# Altium footprint library DrPCB.PcbLib: 910 footprints (part 23 of 57)
Each footprint in its own frame and in the unit in brackets; x right, y up, seen from the top. Pads: shape width x height; smd on the part's side, far side on the other; paste and mask are expansions set on the pad; w line width, h text height; cw(c..) or ccw(c..) is an arc to the next point about the centre after c.
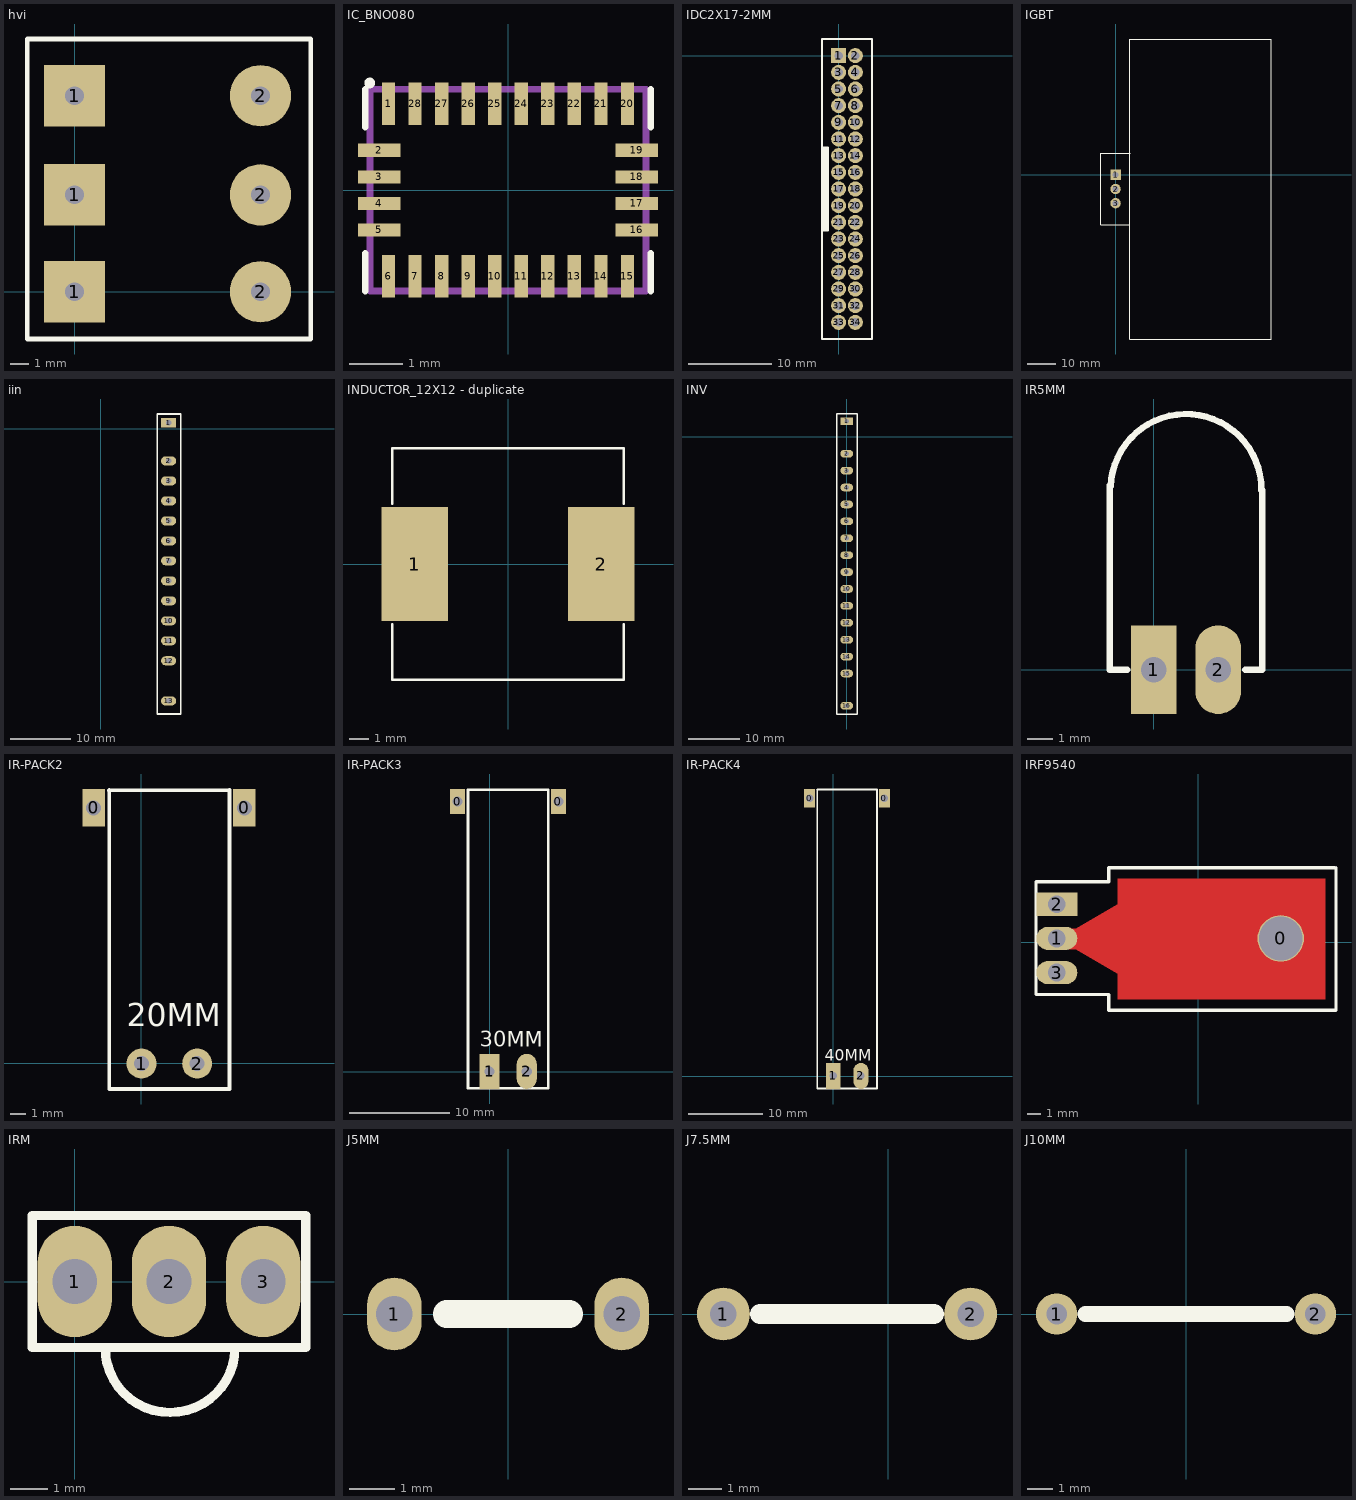
[diagram p22: the footprints below, top view; thin cyan lines are the x and y axes]

## hvi [mm]
pads (6):
  rect 3.3x3.3 hole 1: 1(0,0) 1(0,5.207) 1(0,10.541)
  round 3.3 hole 1: 2(10,0) 2(10,5.207) 2(10,10.541)
Top Overlay:
  lines w0.254: -2.54,-2.54 12.7,-2.54 12.7,13.589 -2.54,13.589 -2.54,-2.54

## IC_BNO080 [mm]
pads (28):
  rect 0.25x0.8 smd: 1(-2.25,1.625) 6(-2.25,-1.625) 7(-1.75,-1.625) 8(-1.25,-1.625) 9(-0.75,-1.625) 10(-0.25,-1.625) 11(0.25,-1.625) 12(0.75,-1.625) 13(1.25,-1.625) 14(1.75,-1.625) 15(2.25,-1.625) 20(2.25,1.625) 21(1.75,1.625) 22(1.25,1.625) 23(0.75,1.625) 24(0.25,1.625) 25(-0.25,1.625) 26(-0.75,1.625) 27(-1.25,1.625) 28(-1.75,1.625)
  rect 0.8x0.25 smd: 2(-2.425,0.75) 3(-2.425,0.25) 4(-2.425,-0.25) 5(-2.425,-0.75) 16(2.425,-0.75) 17(2.425,-0.25) 18(2.425,0.25) 19(2.425,0.75)
Top Overlay:
  circle w0.1: c-2.603,2.019 r0.05
  lines w0.127: -2.689,-1.9 -2.689,-1.188 ; -2.689,1.188 -2.689,1.9 ; 2.689,-1.9 2.689,-1.188 ; 2.689,1.188 2.689,1.9
Mechanical 13:
  lines w0.127: -2.6,-1.9 2.6,-1.9 2.6,1.9 -2.6,1.9 -2.6,-1.9
3D body "BNO080--3DModel-STEP-56544.STEP": height 1.18, standoff 0, extent -2.6,-1.9 2.6,1.9

## IDC2X17-2MM [mm]
pads (34):
  rect 1.8x1.8 hole 1: 1(0,0)
  round 1.8 hole 1: 2(2,0) 3(0,-2) 4(2,-2) 5(0,-4) 6(2,-4) 7(0,-6) 8(2,-6) 9(0,-8) 10(2,-8) 11(0,-10) 12(2,-10) 13(0,-12) 14(2,-12) 15(0,-14) 16(2,-14) 17(0,-16) 18(2,-16) 19(0,-18) 20(2,-18) 21(0,-20) 22(2,-20) 23(0,-22) 24(2,-22) 25(0,-24) 26(2,-24) 27(0,-26) 28(2,-26) 29(0,-28) 30(2,-28) 31(0,-30) 32(2,-30) 33(0,-32) 34(2,-32)
Top Overlay:
  lines w0.254: -1.905,-20.955 -1.27,-20.955 -1.27,-11.049 -1.905,-11.049 ; -1.778,-20.955 -1.778,-11.049 ; -1.524,-20.955 -1.524,-11.049 ; -2,-34 4,-34 4,2 -2,2 -2,-34

## IGBT [mm]
pads (3):
  rect 3.7x3.7 hole 2: 1(0,0)
  round 3.7 hole 2: 2(0,-5) 3(0,-10)
Top Overlay:
  lines w0.254: 4.826,-17.653 -5.207,-17.653 -5.207,7.62 5.207,7.62 ; 5,-10.16 5,-58 55,-58 ; 5.08,-10.16 5.08,48 ; 5.08,48.006 55,48.006 ; 54.991,-57.991 54.991,48.006

## iin [mm]
pads (13):
  rect 2.5x1.5 hole 0.9: 1(11.176,0.968)
  oval 2.5x1.5 hole 0.9: 2(11.176,-5.332) 3(11.176,-8.632) 4(11.176,-11.932) 5(11.176,-15.232) 6(11.176,-18.532) 7(11.176,-21.832) 8(11.176,-25.132) 9(11.176,-28.432) 10(11.176,-31.732) 11(11.176,-35.032) 12(11.176,-38.332) 13(11.176,-44.958)
Top Overlay:
  lines w0.254: 9.271,-47.117 9.271,2.413 13.208,2.413 13.208,-47.117 9.271,-47.117

## INDUCTOR_12X12 - duplicate [mm]
pads (2):
  rect 3.5x6 smd: 1(-4.9,0) 2(4.9,0)
Top Overlay:
  lines w0.15: -6.1,-3.175 -6.1,-6.1 6.1,-6.1 6.1,-3.175 ; -6.1,3.175 -6.1,6.1 6.1,6.1 6.1,3.175
3D body "User Library-DE1207.step": height 8, standoff 0, extent -6,-6 6,6

## INV [mm]
pads (16):
  rect 2.5x1.5 hole 0.9: 1(0,3)
  oval 2.5x1.5 hole 0.9: 2(0,-3.3) 3(0,-6.6) 4(0,-9.9) 5(0,-13.2) 6(0,-16.5) 7(0,-19.8) 8(0,-23.1) 9(0,-26.4) 10(0,-29.7) 11(0,-33) 12(0,-36.3) 13(0,-39.6) 14(0,-42.9) 15(0,-46.2) 16(0,-52.5)
Top Overlay:
  lines w0.254: -1.905,-54.102 2.032,-54.102 2.032,4.445 -1.905,4.445 -1.905,-54.102

## IR5MM [mm]
pads (2):
  rect 1.8x3.5 hole 1: 1(0,0)
  oval 1.8x3.5 hole 1: 2(2.54,0)
Top Overlay:
  lines w0.254: -1.75,0 -1.05,0 ; -1.741,-0.003 -1.741,7.283 ; -1.703,7.234 cw(c1.27,7.117) 4.246,7.088 ; 3.611,0 4.275,0 ; 4.278,0 4.278,7.092

## IR-PACK2 [mm]
pads (4):
  rect 1.5x2.5 hole 1: 0(-3.175,17.018) 0(6.858,17.018)
  round 2 hole 1: 1(0.013,-0.011) 2(3.719,-0.011)
Top Overlay:
  lines w0.254: -2.166,18.163 -2.141,18.187 5.861,18.187 ; -2.138,-1.693 -2.138,18.199 ; -2.127,-1.7 5.873,-1.7 ; 5.87,-1.7 5.87,18.201
  text "20MM" at -0.959,2.464 h1.52

## IR-PACK3 [mm]
pads (4):
  rect 1.5x2.5 hole 1: 0(-3.175,26.924) 0(6.858,26.924)
  rect 2x3.5 hole 1: 1(0.006,0.017)
  oval 2x3.5 hole 1: 2(3.712,0.017)
Top Overlay:
  lines w0.254: -2.166,28.069 -2.141,28.093 ; -2.144,-1.665 -2.144,28.095 -2.125,28.114 5.857,28.114 ; -2.133,-1.672 5.867,-1.672 ; 5.863,-1.672 5.863,28.108
  text "30MM" at -0.965,2.492 h1.52

## IR-PACK4 [mm]
pads (4):
  rect 1.5x2.5 hole 1: 0(-3.175,37.211) 0(6.858,37.211)
  rect 2x3.5 hole 1: 1(0.004,0.057)
  oval 2x3.5 hole 1: 2(3.71,0.057)
Top Overlay:
  lines w0.254: -2.166,38.356 -2.141,38.38 5.861,38.38 ; -2.146,-1.625 -2.146,38.375 ; -2.135,-1.632 5.865,-1.632 ; 5.861,-1.632 5.861,38.368
  text "40MM" at -1.107,2.074 h1.52

## IRF9540 [mm]
pads (4):
  round 3.4 hole 3.2: 0(6.058,0.27)
  oval 3x1.7 hole 1.3: 1(-10.342,0.27) 3(-10.342,-2.23)
  rect 3x1.7 hole 1.3: 2(-10.342,2.77)
Top Layer:
  rectangle: -5.897,-4.215 9.343,4.675
  rectangle: -10.342,-0.532 -5.77,0.992
  region: -5.897,2.77 -8.945,0.992 -8.945,-0.532 -5.897,-2.31
Top Overlay:
  lines w0.254: 9.978,5.437 -6.532,5.437 -6.532,4.421 -11.866,4.421 -11.866,-3.834 -6.532,-3.834 -6.532,-4.977 10.105,-4.977 10.105,5.437

## IRM [mm]
pads (3):
  oval 2x3 hole 1.2: 1(0,0) 2(2.54,0) 3(5.08,0)
Top Overlay:
  lines w0.254: 0.818,-1.778 ccw(c2.568,-1.778) 4.318,-1.778 ; 6.223,1.722 6.223,-1.778 -1.143,-1.778 -1.143,1.778 6.223,1.778

## J5MM [mm] "5.08 mm (200mil) Jumper wire"
pads (2):
  oval 1.2x1.6 hole 0.8: 1(-2.5,0) 2(2.5,0)
Top Overlay:
  lines w0.61: -1.346,0 1.346,0
3D body: height 0.5, standoff -2, extent 2.19,-0.35 2.89,0.35
3D body: height 0.5, standoff -2, extent -2.89,-0.35 -2.19,0.35
3D body: height 0.85, standoff 0.15, extent -2.54,-0.35 2.54,0.35
3D body: height 0.85, standoff 0.15, extent 2.19,-0.35 2.89,0.35
3D body: height 0.85, standoff 0.15, extent -2.89,-0.35 -2.19,0.35

## J7.5MM [mm] "10.16 mm (400 mil) Jumper wire"
pads (2):
  round 1.6 hole 0.8: 1(-5,0) 2(2.5,0)
Top Overlay:
  lines w0.61: -3.886,0 1.386,0
3D body: height 0.5, standoff -2, extent 2.073,-0.348 2.77,0.351
3D body: height 0.5, standoff -2, extent -5.35,-0.35 -4.65,0.35
3D body: height 0.85, standoff 0.15, extent -5.08,-0.347 2.42,0.35
3D body: height 0.85, standoff 0.15, extent 2.07,-0.346 2.77,0.349
3D body: height 0.85, standoff 0.15, extent -5.35,-0.35 -4.65,0.35

## J10MM [mm] "10.16 mm (400 mil) Jumper wire"
pads (2):
  round 1.6 hole 0.8: 1(-5,0) 2(5,0)
Top Overlay:
  lines w0.61: -3.886,0 3.886,0
3D body: height 0.85, standoff 0.15, extent -5.35,-0.35 -4.65,0.35
3D body: height 0.85, standoff 0.15, extent 4.57,-0.348 5.27,0.352
3D body: height 0.85, standoff 0.15, extent -5.08,-0.347 4.92,0.35
3D body: height 0.5, standoff -2, extent -5.35,-0.35 -4.65,0.35
3D body: height 0.5, standoff -2, extent 4.57,-0.348 5.27,0.351